# Altium footprint library nRF52-Intro.PcbLib: 48 footprints (part 2 of 3)
Each footprint in its own frame and in the unit in brackets; x right, y up, seen from the top. Pads: shape width x height; smd on the part's side, far side on the other; paste and mask are expansions set on the pad; w line width, h text height; cw(c..) or ccw(c..) is an arc to the next point about the centre after c.
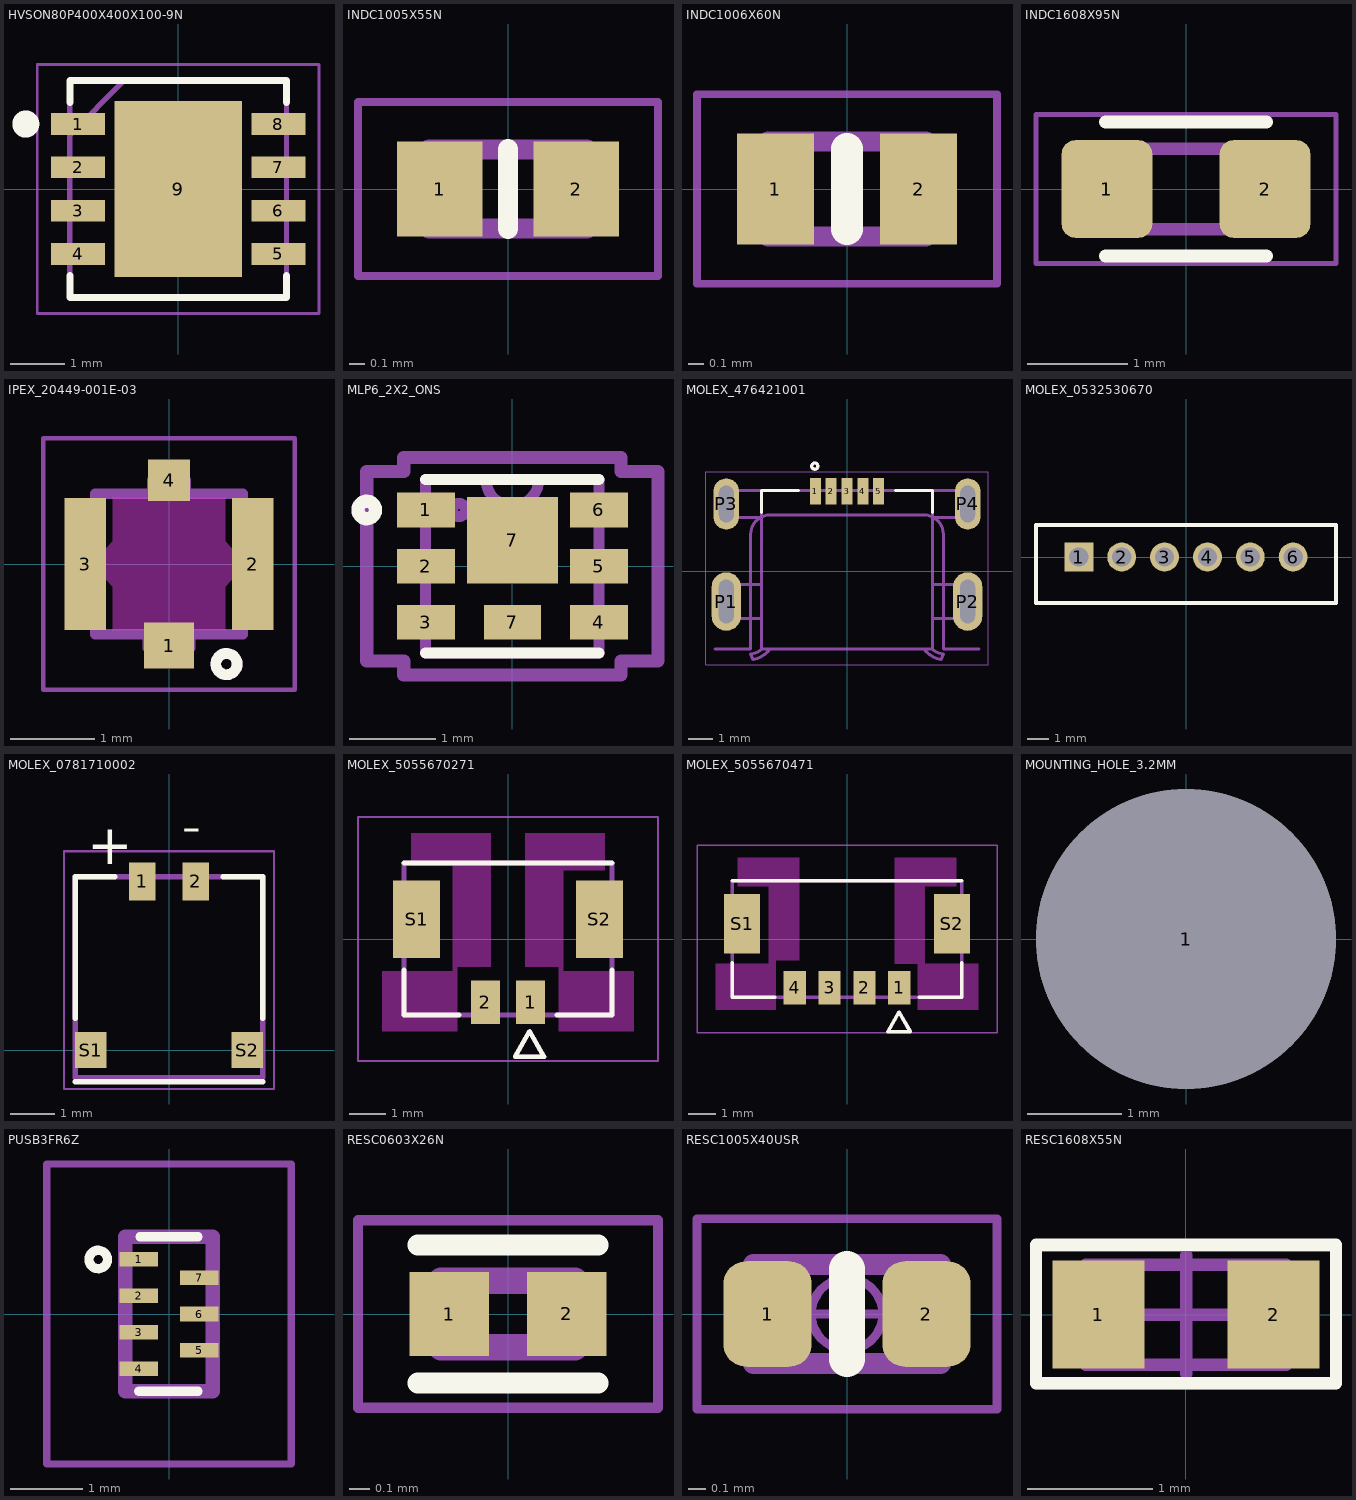
[diagram p1: the footprints below, top view; thin cyan lines are the x and y axes]

## HVSON80P400X400X100-9N [mm]
pads (9):
  rect 1x0.4 smd mask+0.051: 1(-1.85,1.2) 2(-1.85,0.4) 3(-1.85,-0.4) 4(-1.85,-1.2) 5(1.85,-1.2) 6(1.85,-0.4) 7(1.85,0.4) 8(1.85,1.2)
  rect 2.35x3.25 smd mask+0.051: 9(0,0)
Top Overlay:
  circle w0.25: c-2.815,1.2 r0.125
  lines w0.127: -2,-1.6 -2,-2 2,-2 2,-1.6 ; -2,1.6 -2,2 2,2 2,1.6
Top Assembly:
  lines w0.1: -2,1 -1,2 ; -2,-2 2,-2 2,2 -2,2 -2,-2
  text ".Designator" at -0.665,-0.391 h1.27
Top Courtyard:
  lines w0.05: -2.6,-2.3 -2.6,2.3 2.6,2.3 2.6,-2.3 -2.6,-2.3
3D body "PCF8523TK_1,118.stp": height 1, standoff 0, extent -2.05,-2 2.05,2

## INDC1005X55N [mm]
pads (2):
  rect 0.54x0.6 smd mask+0.051: 1(-0.432,0) 2(0.432,0)
Top Overlay:
  lines w0.127: 0,-0.254 0,0.254
Top Assembly:
  lines w0.127: -0.5,-0.25 0.5,-0.25 0.5,0.25 -0.5,0.25 -0.5,-0.25
  text ".Designator" at -0.348,-0.219 h0.76
Top Courtyard:
  lines w0.05: -0.95,-0.55 0.95,-0.55 0.95,0.55 -0.95,0.55 -0.95,-0.55
3D body "LQG15HS4N7B02D.STEP": height 0.55, standoff 0, extent -0.5,-0.25 0.5,0.25

## INDC1006X60N [mm]
pads (2):
  rect 0.49x0.7 smd mask+0.051: 1(-0.453,0) 2(0.453,0)
Top Overlay:
  lines w0.203: 0,-0.254 0,0.254
Top Assembly:
  lines w0.127: -0.5,-0.3 -0.5,0.3 0.5,0.3 0.5,-0.3 -0.5,-0.3
  text ".Designator" at -0.453,-0.33 h0.76
Top Courtyard:
  lines w0.05: -0.95,-0.6 -0.95,0.6 0.95,0.6 0.95,-0.6 -0.95,-0.6
3D body "IND_1005_TDK.step": height 0.5, standoff 0, extent -0.5,-0.3 0.5,0.3

## INDC1608X95N [mm]
pads (2):
  rrect30% 0.9x0.97 smd: 1(-0.785,0) 2(0.785,0)
Top Overlay:
  lines w0.127: -0.8,-0.665 0.8,-0.665 ; -0.8,0.665 0.8,0.665
Top Assembly:
  lines w0.127: -0.8,-0.4 -0.8,0.4 0.8,0.4 0.8,-0.4 -0.8,-0.4
  text ".Designator" at -0.435,-0.357 h1.27
Top Courtyard:
  lines w0.05: -1.49,-0.74 1.49,-0.74 1.49,0.74 -1.49,0.74 -1.49,-0.74
3D body "IND_1608_TDK.step": height 0.8, standoff 0, extent -0.8,-0.4 0.8,0.4

## IPEX_20449-001E-03 [mm]
pads (4):
  rect 0.6x0.55 smd: 1(0,-0.975)
  rect 0.5x1.58 smd: 2(1,0) 3(-1,0)
  rect 0.5x0.5 smd: 4(0,1)
Top Overlay:
  circle w0.127: c0.686,-1.194 r0.127
Keep-Out Layer:
  region: 0.67,0.27 0.75,0.19 0.75,-0.19 0.67,-0.27 0.67,-0.79 0.3,-0.79 0.3,-0.7 -0.3,-0.7 -0.3,-0.79 -0.67,-0.79 -0.67,-0.27 -0.75,-0.19 -0.75,0.19 -0.67,0.27 -0.67,0.79 -0.25,0.79 -0.25,0.75 0.25,0.75 0.25,0.79 0.67,0.79
Top Assembly:
  circle w0.127: c0.686,-1.194 r0.127
  lines w0.127: -1,-0.7 -0.88,-0.7 -0.88,-0.84 -0.25,-0.84 -0.25,-1 0.25,-1 0.25,-0.84 0.88,-0.84 0.88,-0.7 1,-0.7 1,0.7 0.88,0.7 0.88,0.84 0.2,0.84 0.2,1 -0.2,1 -0.2,0.84 -0.88,0.84 -0.88,0.7 -1,0.7 -1,-0.7
Top Courtyard:
  lines w0.05: -1.5,-1.5 -1.5,1.5 1.5,1.5 1.5,-1.5 -1.5,-1.5
3D body "20449-001E-03--3DModel-STEP-231308.STEP": height 0.6, standoff 0, extent -1,-1 1,1

## MLP6_2X2_ONS [mm]
pads (8):
  rect 0.67x0.4 smd paste+0 mask+0: 1(-1,0.65) 2(-1,0) 3(-1,-0.65) 4(1,-0.65) 5(1,0) 6(1,0.65)
  rect 0.66x0.4 smd paste+0 mask+0: 7(0,-0.65)
  rect 1.05x1 smd paste+0 mask+0: 7(0,0.3)
Top Overlay:
  circle w0.152: c-1.684,0.65 r0.102
  lines w0.127: -1.003,-1.003 1.003,-1.003 ; -1.003,1.003 1.003,1.003
Top Assembly:
  circle w0.127: c-0.617,0.65 r0.076
  lines w0.127: -0.305,1.003 ccw(c0,1.003) 0.305,1.003 ; -1.003,-1.003 -1.003,1.003 1.003,1.003 1.003,-1.003 -1.003,-1.003
  text ".Designator" at -0.577,-0.387 h1.27
Top Courtyard:
  lines w0.152: -1.684,-1.094 -1.257,-1.094 -1.257,-1.257 1.257,-1.257 1.257,-1.094 1.684,-1.094 1.684,1.094 1.257,1.094 1.257,1.257 -1.257,1.257 -1.257,1.094 -1.684,1.094 -1.684,-1.094
3D body "MLP6_2X2_ONS.step": height 0.81, standoff 0, extent -1.125,-1.003 1.125,1.003

## MOLEX_476421001 [mm]
pads (9):
  rect 0.45x1.1 smd mask+0.051: 1(-1.3,3.285) 2(-0.65,3.285) 3(0,3.285) 4(0.65,3.285) 5(1.3,3.285)
  oval 1.2x2.4 hole 0.6 slot 1.8 at 90 deg: P1(-4.95,-1.235) P2(4.95,-1.235)
  oval 1.05x2.1 hole 0.6 slot 1.5 at 90 deg: P3(-4.95,2.765) P4(4.95,2.765)
Top Overlay:
  circle w0.127: c-1.323,4.315 r0.127
  lines w0.127: -3.5,2.415 -3.5,3.315 -2,3.315 ; 2,3.315 3.5,3.315 3.5,2.415
Mechanical 3:
  lines w0.127: -5.4,-3.185 -3.95,-3.185 -3.95,1.515 cw(c-3.15,1.515) -3.15,2.315 3.15,2.315 cw(c3.15,1.515) 3.95,1.515 3.95,-3.185 5.4,-3.185
Top Assembly:
  circle w0.127: c-1.323,4.315 r0.127
  lines w0.127: -3.85,-3.615 -3.95,-3.385 ccw(c-4,-2.667) -3.5,-3.185 ; -3.841,-3.613 ccw(c-4.091,-2.438) -3.144,-3.178 ; -3.55,-0.535 -5.1,-0.535 -5.1,-1.935 -3.5,-1.935 ; 3.144,-3.178 ccw(c4.091,-2.438) 3.841,-3.613 ; 3.85,-3.615 3.95,-3.385 cw(c4,-2.667) 3.5,-3.185 ; -3.5,-3.185 -3.15,-3.185 3.5,-3.185 ; -3.5,-3.185 -3.5,-1.935 ; -3.5,-1.935 -3.5,2.215 ; -3.5,2.215 -5.1,2.215 -5.1,3.315 -3.5,3.315 ; -3.5,2.215 -3.5,3.315 ; -3.5,3.315 3.5,3.315 ; 3.5,-3.185 3.5,-1.935 ; 3.5,-1.935 5.1,-1.935 5.1,-0.535 3.5,-0.535 ; 3.5,-1.935 3.5,-0.535 ; 3.5,-0.535 3.5,2.215 ; 3.5,2.215 5.1,2.215 5.1,3.315 3.5,3.315 ; 3.5,2.215 3.5,3.315
  text ".Designator" at -0.181,-0.175 h1.27
Top Courtyard:
  lines w0.05: -5.8,-3.835 -5.8,4.085 5.8,4.085 5.8,-3.835 -5.8,-3.835
3D body "476421001.stp": height 1.84, standoff -0.89, extent -5.1,-3.185 5.1,3.615

## MOLEX_0532530670 [mm]
pads (6):
  rect 1.35x1.35 hole 0.9: 1(-5,0)
  round 1.35 hole 0.9: 2(-3,0) 3(-1,0) 4(1,0) 5(3,0) 6(5,0)
Top Overlay:
  lines w0.2: -7,-2.15 -6,-2.15 7,-2.15 7,1.5 -7,1.5 -7,-1.15 -7,-2.15
Top Assembly:
  lines w0.1: -7,-2.15 -7,1.5 7,1.5 7,-2.15 -7,-2.15
  text ".Designator" at -1,-0.325 h1.27
3D body "532530670.stp": height 5.55, standoff -3.45, extent -7,-2.15 7,1.5

## MOLEX_0781710002 [mm]
pads (4):
  rect 0.6x0.85 smd mask+0.051: 1(-0.6,3.775) 2(0.6,3.775)
  rect 0.7x0.8 smd mask+0.051: S1(-1.75,0) S2(1.75,0)
Top Overlay:
  lines w0.127: -2.1,-0.71 2.1,-0.71 ; -2.1,0.71 -2.1,3.88 -1.21,3.88 ; 1.21,3.88 2.1,3.88 2.1,0.71
  text "-" at 0.283,4.316 h1.52
  text "+" at -1.828,3.862 h1.52
Top Assembly:
  lines w0.127: -2.1,-0.62 2.1,-0.62 2.1,3.88 -2.1,3.88 -2.1,-0.62
  text ".Designator" at -0.305,1.393 h1.27
Top Courtyard:
  lines w0.05: -2.35,-0.87 2.35,-0.87 2.35,4.45 -2.35,4.45 -2.35,-0.87
3D body "0781710002--3DModel-STEP-361473.STEP": height 1.45, standoff 0, extent -2.1,-0.62 2.1,3.91

## MOLEX_5055670271 [mm]
pads (4):
  rect 0.8x1.2 smd mask+0: 1(0.625,-1.75) 2(-0.625,-1.75)
  rect 1.3x2.15 smd mask+0: S1(-2.525,0.545) S2(2.525,0.545)
Top Layer keep-out:
  region: -0.475,-0.762 -1.397,-0.762 -1.397,-2.55 -3.475,-2.55 -3.475,-0.889 -1.524,-0.889 -1.524,2.032 -2.675,2.032 -2.675,2.92 -0.475,2.92
  region: 2.675,1.905 1.524,1.905 1.524,-0.889 3.475,-0.889 3.475,-2.55 1.397,-2.55 1.397,-0.762 0.475,-0.762 0.475,2.92 2.675,2.92
Top Overlay:
  lines w0.127: -2.875,-0.85 -2.875,-2.1 -1.345,-2.1 ; -2.875,2.1 2.875,2.1 ; 1.345,-2.1 2.875,-2.1 2.875,-0.85 ; 0.199,-3.255 0.999,-3.255 0.599,-2.555 0.199,-3.255
Top Solder:
  region: -0.149,-2.426 -1.101,-2.426 -1.101,-1.074 -0.149,-1.074
  region: 1.101,-2.426 0.149,-2.426 0.149,-1.074 1.101,-1.074
  region: -1.799,-0.606 -3.251,-0.606 -3.251,1.696 -1.799,1.696
  region: 3.251,-0.606 1.799,-0.606 1.799,1.696 3.251,1.696
Top Assembly:
  lines w0.127: -2.875,-2.1 2.875,-2.1 2.875,2.1 -2.875,2.1 -2.875,-2.1 ; 0.199,-3.255 0.999,-3.255 0.599,-2.555 0.199,-3.255
  text ".Designator" at -1.025,0.008 h1.27
Top Courtyard:
  lines w0.05: -4.145,-3.37 -4.145,3.37 4.145,3.37 4.145,-3.37 -4.145,-3.37
3D body "5055670271.stp": height 3.91, standoff 0.01, extent -2.875,-2.1 2.875,2.1

## MOLEX_5055670471 [mm]
pads (6):
  rect 0.8x1.2 smd mask+0: 1(1.875,-1.75) 2(0.625,-1.75) 3(-0.625,-1.75) 4(-1.875,-1.75)
  rect 1.3x2.15 smd mask+0: S1(-3.775,0.545) S2(3.775,0.545)
Top Layer keep-out:
  region: -1.725,-0.762 -2.565,-0.762 -2.565,-2.55 -4.725,-2.55 -4.725,-0.889 -2.819,-0.889 -2.819,1.905 -3.925,1.905 -3.925,2.92 -1.725,2.92
  region: 3.925,1.905 2.794,1.905 2.794,-0.889 4.725,-0.889 4.725,-2.55 2.54,-2.55 2.54,-0.889 1.725,-0.889 1.725,2.92 3.925,2.92
Top Overlay:
  lines w0.127: -4.125,-0.85 -4.125,-2.1 -2.595,-2.1 ; -4.125,2.1 4.125,2.1 ; 2.595,-2.1 4.125,-2.1 4.125,-0.85 ; 1.475,-3.331 1.875,-2.631 2.275,-3.331 1.475,-3.331
Top Solder:
  region: 4.501,-0.606 3.049,-0.606 3.049,1.696 4.501,1.696
  region: -3.049,-0.606 -4.501,-0.606 -4.501,1.696 -3.049,1.696
  region: 2.351,-2.426 1.399,-2.426 1.399,-1.074 2.351,-1.074
  region: 1.101,-2.426 0.149,-2.426 0.149,-1.074 1.101,-1.074
  region: -0.149,-2.426 -1.101,-2.426 -1.101,-1.074 -0.149,-1.074
  region: -1.399,-2.426 -2.351,-2.426 -2.351,-1.074 -1.399,-1.074
Top Assembly:
  lines w0.127: -4.125,-2.1 -4.125,2.1 4.125,2.1 4.125,-2.1 -4.125,-2.1 ; 1.475,-3.331 1.875,-2.631 2.275,-3.331 1.475,-3.331
  text ".Designator" at -1,-0.339 h1.27
Top Courtyard:
  lines w0.05: -5.395,-3.37 5.395,-3.37 5.395,3.37 -5.395,3.37 -5.395,-3.37
3D body "step_temp.STEP": height 3.91, standoff 0.01, extent -4.125,-2.1 4.125,2.1

## MOUNTING_HOLE_3.2MM [mm] "NPTH 2.2mm Hole Used in Raspberry Pi Camera"
pads (1):
  round 3.2 hole 3.2 unplated: 1(0,0)

## PUSB3FR6Z [mm]
pads (7):
  rect 0.53x0.2 smd mask+0.051: 1(-0.415,0.75) 2(-0.415,0.25) 3(-0.415,-0.25) 4(-0.415,-0.75) 5(0.415,-0.5) 6(0.415,0) 7(0.415,0.5)
Top Overlay:
  circle w0.127: c-0.973,0.75 r0.127
  lines w0.127: -0.415,-1.063 0.4,-1.063 ; -0.4,1.063 0.4,1.063
Top Assembly:
  lines w0.2: -0.6,-1.063 0.6,-1.063 0.6,1.063 -0.6,1.063 -0.6,-1.063
  text ".Designator" at -0.308,-0.394 h1.52
Top Courtyard:
  lines w0.1: -1.68,-2.063 1.68,-2.063 1.68,2.063 -1.68,2.063 -1.68,-2.063
3D body "PUSB3FR6Z.STEP": height 0.5, standoff 0, extent -0.55,-1.062 0.55,1.062

## RESC0603X26N [mm]
pads (2):
  rect 0.38x0.4 smd mask+0.025: 1(-0.281,0) 2(0.281,0)
Top Overlay:
  lines w0.1: -0.432,-0.33 0.432,-0.33 ; -0.432,0.33 0.432,0.33
Top Assembly:
  lines w0.127: -0.32,-0.16 0.32,-0.16 0.32,0.16 -0.32,0.16 -0.32,-0.16
  text ".Designator" at 0.432,-0.159 h0.51
Top Courtyard:
  lines w0.05: -0.718,-0.448 0.718,-0.448 0.718,0.448 -0.718,0.448 -0.718,-0.448
3D body "RE0201BRE0710KL.STEP": height 0.26, standoff 0, extent -0.3,-0.15 0.3,0.15

## RESC1005X40USR [mm] "Resistor, Chip; 1.00 mm L X 0.50 mm W X 0.40 mm H body"
height 0.4
pads (2):
  rrect52% 0.5x0.6 smd mask+0.025: 1(-0.45,0) 2(0.45,0)
Top Overlay:
  lines w0.203: 0,-0.254 0,0.254
Top Assembly:
  lines w0.12: -0.53,-0.28 -0.53,0.28 0.53,0.28 0.53,-0.28 -0.53,-0.28
  text ".Designator" at 0.911,-0.522 h1.27
Top Courtyard:
  circle w0.05: c0,0 r0.202
  lines w0.05: -0.27,0 0.27,0 ; 0,-0.27 0,0.27 ; -0.85,-0.54 -0.85,0.54 0.85,0.54 0.85,-0.54 -0.85,-0.54
3D body "RESC1005X40USR.STEP": height 0.4, standoff 0, extent -0.5,-0.25 0.5,0.25

## RESC1608X55N [mil] "Chip Capacitor, Body 1.6x0.8mm, IPC High Density"
height 51.18
pads (2):
  rect 29x34 smd mask+2: 1(-27.56,0) 2(27.56,0)
Top Overlay:
  lines w3.94: -47.24,21.65 -47.24,-21.65 47.24,-21.65 47.24,21.65 ; -47.24,22 47.24,22
Top Assembly:
  lines w3.94: -31.5,-15.75 31.5,-15.75 31.5,15.75 -31.5,15.75 -31.5,-15.75
  text ".Designator" at -31.5,-15.75 h40
Top Courtyard:
  lines w3.94: -18.7,0 18.7,0 ; 0,-18.7 0,18.7 ; -47.24,-21.65 -47.24,21.65 47.24,21.65 47.24,-21.65 -47.24,-21.65
3D body "STD(0603) M(1608).STEP": height 17.72, standoff 0, extent -31.49,-15.74 31.5,15.75